# Altium footprint library 示波器.PcbLib: 26 footprints (part 1 of 2)
Each footprint in its own frame and in the unit in brackets; x right, y up, seen from the top. Pads: shape width x height; smd on the part's side, far side on the other; paste and mask are expansions set on the pad; w line width, h text height; cw(c..) or ccw(c..) is an arc to the next point about the centre after c.
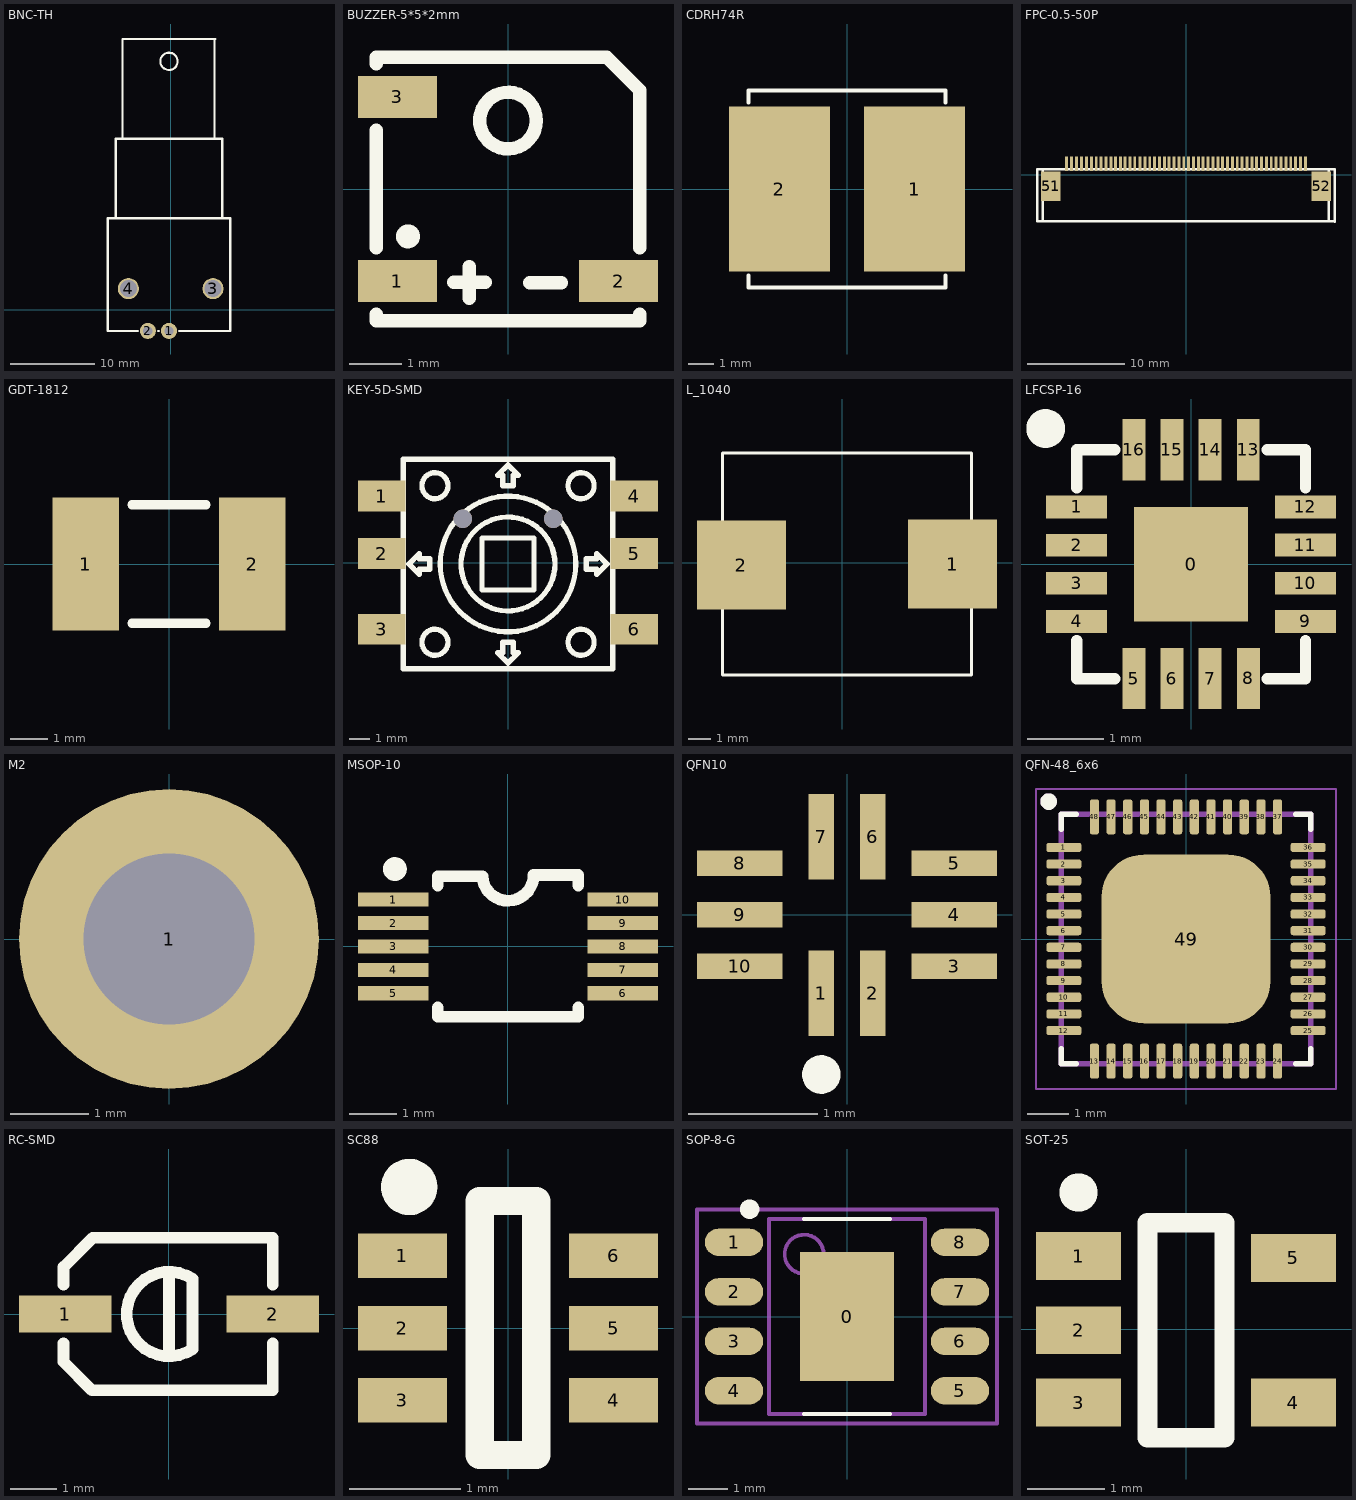
[diagram p0: the footprints below, top view; thin cyan lines are the x and y axes]

## BNC-TH [mm]
pads (4):
  round 1.9 hole 1.1: 1(-0.2,-2.5) 2(-2.7,-2.5)
  round 2.5 hole 2: 3(5,2.5) 4(-5,2.5)
Top Overlay:
  circle w0.254: c-0.2,29.377 r1.024
  lines w0.254: -6.5,10.82 -6.5,20.22 6.1,20.22 6.1,10.82 ; -5.7,20.22 -5.7,32.02 5.3,32.02 ; -3.881,-2.5 -7.45,-2.5 -7.45,10.82 7.05,10.82 7.05,-2.5 0.981,-2.5 ; -1.519,-2.5 -1.381,-2.5 ; 5.178,20.22 5.178,32.02
3D body "5227677-1.stp": height 16.16, standoff -3.83, extent -7.391,-4.445 7.366,31.115

## BUZZER-5*5*2mm [mm]
pads (3):
  rect 1.5x0.8 smd: 1(-2.1,-1.75) 2(2.1,-1.75) 3(-2.1,1.75)
Top Overlay:
  circle w0.254: c-1.9,-0.9 r0.1
  circle w0.254: c0,1.3 r0.538
  lines w0.254: -2.5,-2.381 -2.5,-2.5 2.5,-2.5 2.5,-2.381 ; -2.5,-1.119 -2.5,1.119 ; -2.5,2.381 -2.5,2.5 1.875,2.5 2.5,1.875 2.5,-1.119 ; -1.033,-1.773 -0.433,-1.773 ; -0.733,-2.073 -0.733,-1.473 ; 0.416,-1.778 1.016,-1.778
3D body "User Library-Beep_5020_SMT.STEP": height 2, standoff -0.01, extent -2.6,-2.6 2.6,2.6

## CDRH74R [mm]
pads (2):
  rect 3.924x6.42 smd: 1(2.628,0) 2(-2.628,0)
Top Overlay:
  lines w0.152: -3.826,-3.362 -3.826,-3.826 3.826,-3.826 3.826,-3.362 ; -3.826,3.362 -3.826,3.826 3.826,3.826 3.826,3.362
3D body "User Library-CDRH74NP-220MC.step": height 4.5, standoff 0, extent -3.65,-3.617 3.65,3.683

## FPC-0.5-50P [mm]
pads (52):
  rect 0.3x1.5 smd: 1(12.27,1.153) 2(11.77,1.153) 3(11.271,1.153) 4(10.77,1.153) 5(10.271,1.153) 6(9.77,1.153) 7(9.271,1.153) 8(8.77,1.153) 9(8.271,1.153) 10(7.77,1.153) 11(7.271,1.153) 12(6.77,1.153) 13(6.271,1.153) 14(5.77,1.153) 15(5.274,1.155) 16(4.771,1.154) 17(4.271,1.153) 18(3.771,1.153) 19(3.271,1.153) 20(2.769,1.156) 21(2.269,1.156) 22(1.769,1.156) 23(1.269,1.156) 24(0.769,1.156) 25(0.269,1.156) 26(-0.232,1.157) 27(-0.732,1.157) 28(-1.231,1.156) 29(-1.731,1.157) 30(-2.232,1.157) 31(-2.731,1.156) 32(-3.231,1.156) 33(-3.731,1.156) 34(-4.231,1.156) 35(-4.731,1.156) 36(-5.271,1.156) 37(-5.771,1.156) 38(-6.271,1.156) 39(-6.732,1.156) 40(-7.231,1.156) 41(-7.731,1.156) 42(-8.231,1.156) 43(-8.73,1.156) 44(-9.232,1.156) 45(-9.732,1.156) 46(-10.232,1.156) 47(-10.731,1.156) 48(-11.271,1.156) 49(-11.771,1.156) 50(-12.271,1.156)
  rect 2x3 smd: 51(-13.925,-1.157) 52(13.925,-1.157)
Top Overlay:
  lines w0.254: -15.305,-4.777 15.295,-4.777 ; -15.305,-4.777 -15.305,0.573 15.295,0.573 ; -14.725,-4.777 -14.725,0.573 ; 14.699,-4.778 14.699,0.572 ; 15.295,-4.787 15.295,0.563
3D body "ffc_fpc_affc25-50-050-shb-t.stp": height 2.26, standoff 0.01, extent -14.55,-4.848 14.55,1.651

## GDT-1812 [mm]
pads (2):
  rect 1.8x3.6 smd: 1(-2.25,0) 2(2.25,0)
Top Overlay:
  lines w0.254: -1,-1.6 1,-1.6 ; -1,1.6 1,1.6
3D body "2051-09-sm-rplf.stp": height 2.67, standoff -0.03, extent -2.25,-1.6 2.25,1.6

## KEY-5D-SMD [mm]
pads (8):
  rect 2.3x1.5 smd: 1(-6.15,3.238) 2(-6.15,0.445) 3(-6.15,-3.238) 4(6.15,3.238) 5(6.15,0.445) 6(6.15,-3.238)
  round 0.9 hole 0.9 unplated: ""(-2.2,2.136) ""(2.2,2.136)
Top Overlay:
  circle w0.254: c0,-0.064 r2.286
  circle w0.254: c0,-0.064 r3.302
  circle w0.254: c3.556,-3.873 r0.635
  circle w0.254: c-3.556,-3.873 r0.635
  circle w0.254: c3.556,3.746 r0.635
  circle w0.254: c-3.556,3.746 r0.635
  lines w0.254: -5.1,-5.164 5.1,-5.164 5.1,5.037 -5.1,5.037 -5.1,-5.164 ; -4.826,-0.064 -4.318,0.445 -4.318,0.191 -3.81,0.191 -3.81,-0.318 -4.318,-0.318 -4.318,-0.572 -4.826,-0.064 ; -1.27,-1.333 -1.27,1.206 1.27,1.206 1.27,-1.333 -1.27,-1.333 ; -0.508,-4.381 0,-4.889 0.508,-4.381 0.254,-4.381 0.254,-3.873 -0.254,-3.873 -0.254,-4.381 -0.508,-4.381 ; -0.508,4.255 -0.254,4.255 -0.254,3.746 0.254,3.746 0.254,4.255 0.508,4.255 0,4.763 -0.508,4.255 ; 3.81,-0.318 4.318,-0.318 4.318,-0.572 4.826,-0.064 4.318,0.445 4.318,0.191 3.81,0.191 3.81,-0.318
Mechanical 15:
  circle w0.5: c-6.096,3.048 r0.25
3D body "43447.stp": height 7.1, standoff 0, extent -5.353,-4.873 5.353,5.127

## L_1040 [mm]
height 0.4
pads (2):
  rect 4x4 smd: 1(4.975,-0.05) 2(-4.525,-0.1)
Top Overlay:
  lines w0.127: -5.375,-5.05 -5.375,4.95 5.825,4.95 5.825,-5.05 -5.375,-5.05
3D body "44830.stp": height 3.8, standoff 0, extent -5.373,-5 5.627,5

## LFCSP-16 [mm]
pads (17):
  rect 1.5x1.5 smd: 0(0,0)
  rect 0.8x0.3 smd: 1(-1.5,0.75) 2(-1.5,0.248) 3(-1.5,-0.25) 4(-1.5,-0.75) 9(1.5,-0.75) 10(1.5,-0.25) 11(1.5,0.25) 12(1.5,0.75)
  rect 0.3x0.8 smd: 5(-0.75,-1.5) 6(-0.25,-1.5) 7(0.25,-1.5) 8(0.751,-1.498) 13(0.75,1.5) 14(0.25,1.5) 15(-0.25,1.5) 16(-0.75,1.5)
Top Overlay:
  circle w0.254: c-1.905,1.778 r0.127
  lines w0.15: -1.5,-1 -1.5,-1.5 -1,-1.5 ; -1.5,1 -1.5,1.5 -1,1.5 ; 1,-1.5 1.5,-1.5 1.5,-1 ; 1,1.5 1.5,1.5 1.5,1
3D body "User Library-LFCSP16.step": height 0.73, standoff -0.02, extent -1.478,-1.524 1.524,1.478

## M2 [mm] "M3螺丝孔，孔125Mil，焊盘200Mil"
pads (1):
  round 3.81 hole 2.175: 1(0,0)

## MSOP-10 [mil]
pads (10):
  rect 59.05x12 smd: 1(-96.5,39.37) 2(-96.5,19.68) 3(-96.5,0) 4(-96.5,-19.69) 5(-96.5,-39.37) 6(96.5,-39.37) 7(96.5,-19.69) 8(96.5,0) 9(96.5,19.68) 10(96.5,39.37)
Top Overlay:
  circle w10: c-95,65 r5
  lines w10: -59.05,-51.19 -59.05,-59.05 59.06,-59.05 59.06,-51.19 ; -59.05,51.19 -59.05,59 -21.5,59 ccw(c-0.01,59.92) 21.5,60 59.06,60 59.06,51.19
3D body "User Library-MSOP10-1.step": height 43.11, standoff 0, extent -101.38,-62.99 101.38,62.99

## QFN10 [mm]
pads (10):
  rect 0.2x0.665 smd: 1(-0.2,-0.607) 2(0.2,-0.607) 6(0.2,0.607) 7(-0.2,0.607)
  rect 0.665x0.2 smd: 3(0.832,-0.4) 4(0.832,0) 5(0.832,0.4) 8(-0.832,0.4) 9(-0.832,0) 10(-0.832,-0.4)
Top Overlay:
  circle w0.15: c-0.2,-1.24 r0.075
3D body "User Library-UQFN10 1_4x1_8mm 0_4 pitch with white mark.step": height -0.38, standoff -0.88, extent -0.9,-0.7 0.9,0.7

## QFN-48_6x6 [mm]
pads (49):
  rrect50% 0.84x0.22 smd: 1(-2.935,2.2) 2(-2.935,1.8) 3(-2.935,1.4) 4(-2.935,1) 5(-2.935,0.6) 6(-2.935,0.2) 7(-2.935,-0.2) 8(-2.935,-0.6) 9(-2.935,-1) 10(-2.935,-1.4) 11(-2.935,-1.8) 12(-2.935,-2.2) 25(2.935,-2.2) 26(2.935,-1.8) 27(2.935,-1.4) 28(2.935,-1) 29(2.935,-0.6) 30(2.935,-0.2) 31(2.935,0.2) 32(2.935,0.6) 33(2.935,1) 34(2.935,1.4) 35(2.935,1.8) 36(2.935,2.2)
  rrect50% 0.22x0.84 smd: 13(-2.2,-2.935) 14(-1.8,-2.935) 15(-1.4,-2.935) 16(-1,-2.935) 17(-0.6,-2.935) 18(-0.2,-2.935) 19(0.2,-2.935) 20(0.6,-2.935) 21(1,-2.935) 22(1.4,-2.935) 23(1.8,-2.935) 24(2.2,-2.935) 37(2.2,2.935) 38(1.8,2.935) 39(1.4,2.935) 40(1,2.935) 41(0.6,2.935) 42(0.2,2.935) 43(-0.2,2.935) 44(-0.6,2.935) 45(-1,2.935) 46(-1.4,2.935) 47(-1.8,2.935) 48(-2.2,2.935)
  rrect50% 4.064x4.064 smd paste-3: 49(0,0)
Top Overlay:
  circle w0.2: c-3.302,3.302 r0.1
  lines w0.127: -3,-2.63 -3,-3 -2.63,-3 ; -3,2.63 -3,3 -2.63,3 ; 2.63,-3 3,-3 3,-2.63 ; 2.63,3 3,3 3,2.63
Top Paste:
  region: 1.88,-1.88 0.42,-1.88 0.42,-0.42 1.88,-0.42
  region: -0.42,-1.88 -1.88,-1.88 -1.88,-0.42 -0.42,-0.42
  region: 1.88,0.42 0.42,0.42 0.42,1.88 1.88,1.88
  region: -0.42,0.42 -1.88,0.42 -1.88,1.88 -0.42,1.88
Mechanical 13 (Mech13):
  circle w0.2: c-3.302,3.302 r0.1
  lines w0.127: -3,-3 -3,3 3,3 3,-3 -3,-3
Mechanical 15:
  lines w0.05: -3.605,-3.605 -3.605,3.605 3.605,3.605 3.605,-3.605 -3.605,-3.605
3D body "step_temp.STEP": height 0.9, standoff 0, extent -3,-3 3,3

## RC-SMD [mm]
pads (2):
  rect 2x0.8 smd: 1(-2.25,0) 2(2.25,0)
Top Overlay:
  lines w0.254: -2.286,-0.635 -2.286,-1.035 -1.67,-1.651 2.25,-1.651 2.25,-0.635 ; -2.286,0.635 -2.286,1.017 -1.652,1.651 2.25,1.651 2.25,0.635 ; 0,-0.889 0,0.889 ; 0.508,-0.762 cw(c0,0) 0.508,0.762 0.508,-0.762
3D body "User Library-CAPAE450X150M.STEP": height 1.5, standoff 0, extent -2.123,-1.6 2.377,1.6

## SC88 [mm]
pads (6):
  rect 0.8x0.4 smd: 1(-0.95,0.65) 2(-0.95,0) 3(-0.95,-0.65) 4(0.95,-0.65) 5(0.95,0) 6(0.95,0.65)
Top Overlay:
  circle w0.254: c-0.889,1.27 r0.127
  lines w0.254: -0.254,-1.143 0.254,-1.143 0.254,1.143 -0.254,1.143 -0.254,-1.143
3D body "User Library-sot363.step": height 1, standoff 0, extent -1.15,-1.05 1.15,1.05

## SOP-8-G [mm] "SOIC, 8-Leads, Body 4.9x3.9mm, Pitc"
height 2.72
pads (9):
  rect 2.4x3.3 smd: 0(0,0)
  oval 1.5x0.7 smd: 1(-2.9,1.905) 2(-2.9,0.635) 3(-2.9,-0.635) 4(-2.9,-1.905) 5(2.9,-1.905) 6(2.9,-0.635) 7(2.9,0.635) 8(2.9,1.905)
Top Overlay:
  circle w0.25: c-2.5,2.755 r0.125
  lines w0.1: -1.1,-2.5 1.1,-2.5 ; -1.1,2.5 1.1,2.5
Mechanical 13 (Mech13):
  circle w0.1: c-1.1,1.6 r0.5
  lines w0.1: -2,-2.5 2,-2.5 2,2.5 -2,2.5 -2,-2.5
Mechanical 15:
  lines w0.1: -0.5,0 0.5,0 ; 0,-0.5 0,0.5 ; -3.85,-2.75 3.85,-2.75 3.85,2.75 -3.85,2.75 -3.85,-2.75
3D body "SO-8.STEP": height 1.7, standoff 0, extent -2.45,-3 3.55,1.9

## SOT-25 [mil]
pads (5):
  rect 43.5x24.5 smd: 1(-55,37.5) 2(-55,-0.5) 3(-55,-37.5) 4(55,-37.5) 5(55,36.5)
Top Overlay:
  lines w9.8: -59.9,69.95 ccw(c-55,70) -59.9,70.05
  lines w10: -19.7,-55.6 -19.7,54.6 19.7,54.6 19.7,-55.6 -19.7,-55.6
Mechanical 15:
  lines w0.1: 16.29,10.71 18.29,8.71
3D body "User Library-sot25.step": height 45.28, standoff 0, extent -46.67,-57.13 47.82,60.98